# Altium footprint library Transistor.PcbLib: 86 footprints (part 6 of 6)
Each footprint in its own frame and in the unit in brackets; x right, y up, seen from the top. Pads: shape width x height; smd on the part's side, far side on the other; paste and mask are expansions set on the pad; w line width, h text height; cw(c..) or ccw(c..) is an arc to the next point about the centre after c.
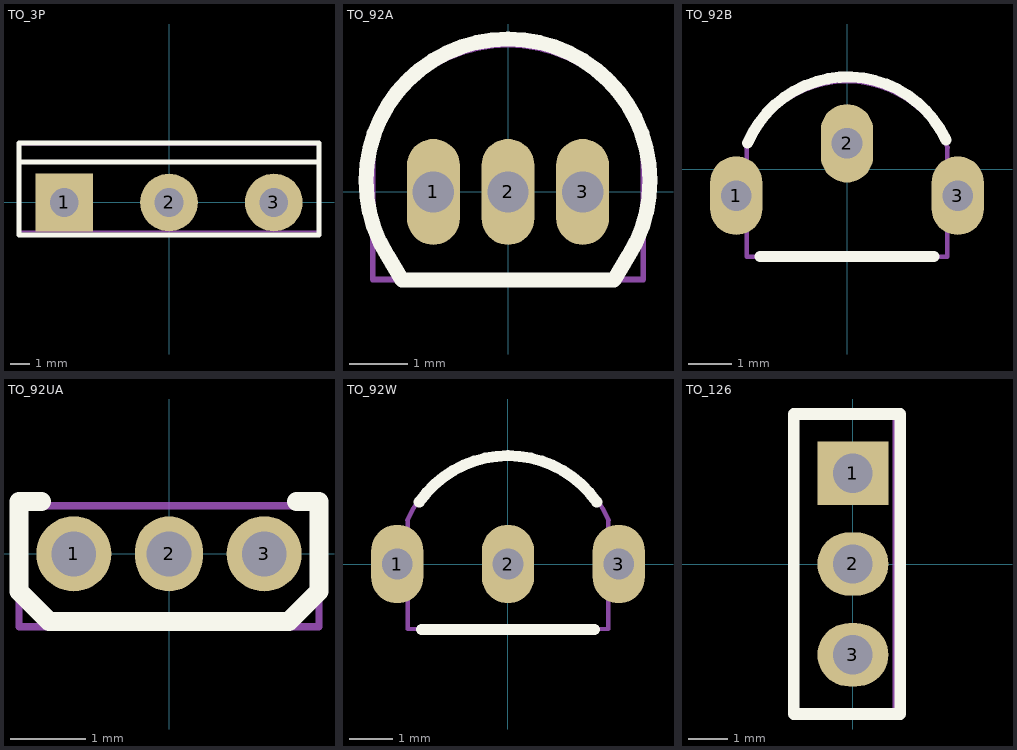
[diagram p5: the footprints below, top view; thin cyan lines are the x and y axes]

## TO_3P [mm]
pads (3):
  rect 3x3 hole 1.5: 1(-5.45,0)
  round 3 hole 1.5: 2(0,0) 3(5.45,0)
Top Overlay:
  lines w0.254: -7.8,2.1 7.8,2.1 ; -7.8,-1.7 -7.8,3.1 7.8,3.1 7.8,-1.7 -7.8,-1.7
Mechanical 15:
  lines w0.1: -7.8,-1.5 -7.8,3 7.8,3 7.8,-1.5 -7.8,-1.5
3D body "TOP-3P.step": height 24.9, standoff -11, extent -7.75,-1.5 7.75,3

## TO_92A [mm]
pads (3):
  oval 0.9x1.8 hole 0.7: 1(-1.27,0) 2(0,0) 3(1.27,0)
Top Overlay:
  lines w0.254: -2.052,-1.086 cw(c0,0.186) 2.052,-1.086 1.8,-1.5 -1.8,-1.5 -2.052,-1.086
Mechanical 15:
  lines w0.1: -2.3,1 -2.3,-1.49 2.3,-1.49 2.3,1 ; -2.295,0.998 cw(c0,0) 2.295,0.998
3D body "TO-92A.STEP": height 7, standoff -4, extent -2.421,-1.49 2.379,2.44

## TO_92B [mm]
pads (3):
  oval 1.2x1.8 hole 0.7: 1(-2.54,-0.6) 2(0,0.6) 3(2.54,-0.6)
Top Overlay:
  lines w0.254: -2.277,0.603 cw(c0.011,-0.363) 2.267,0.677 ; -2,-2 2,-2
Mechanical 15:
  lines w0.1: -2.309,0.504 cw(c0,-0.5) 2.309,0.504 ; -2.3,0.5 -2.3,-2 2.3,-2 2.3,0.5
3D body "TO-92B.STEP": height 7.34, standoff -0.7, extent -2.8,-2 2.88,1.8

## TO_92UA [mm]
pads (3):
  round 1 hole 0.6: 1(-1.27,0) 3(1.27,0)
  oval 0.9x1 hole 0.6: 2(0,0)
Top Overlay:
  lines w0.254: -1.7,0.7 -2,0.7 -2,-0.5 -1.6,-0.9 1.6,-0.9 2,-0.5 2,0.7 1.7,0.7
Mechanical 15:
  lines w0.1: -2,-0.97 -2,0.64 2,0.64 2,-0.97 -2,-0.97
3D body "TO-92UA-SS49E.step": height 5.7, standoff -7.3, extent -2,-0.97 2,0.64

## TO_92W [mm]
pads (3):
  oval 1.2x1.8 hole 0.7: 1(-2.54,0) 2(0,0) 3(2.54,0)
Top Overlay:
  lines w0.254: -2.035,1.425 cw(c0,0) 2.035,1.425 ; -1.98,-1.5 1.98,-1.5
Mechanical 15:
  lines w0.1: -2.309,1.004 cw(c0,0) 2.309,1.004 ; -2.3,1 -2.3,-1.49 2.3,-1.49 2.3,1
3D body "TO-92W.STEP": height 6.7, standoff -4.6, extent -2.73,-1.539 2.8,2.539

## TO_126 [mm]
pads (3):
  rect 1.8x1.6 hole 1: 1(0,2.3)
  oval 1.8x1.6 hole 1: 2(0,0) 3(0,-2.3)
Top Overlay:
  lines w0.3: -1.5,-3.8 -1.5,3.8 1.2,3.8 1.2,-3.8 -1.5,-3.8
Mechanical 15:
  lines w0.1: -1.5,-3.8 1.05,-3.8 1.05,3.8 -1.5,3.8 -1.5,-3.8
3D body "TO-126.step": height 13.19, standoff -3.54, extent -1.5,-3.8 1.05,3.8